# Altium footprint library 布洛电子PCB封装库-通用接插件.PcbLib: 103 footprints (part 2 of 7)
Each footprint in its own frame and in the unit in brackets; x right, y up, seen from the top. Pads: shape width x height; smd on the part's side, far side on the other; paste and mask are expansions set on the pad; w line width, h text height; cw(c..) or ccw(c..) is an arc to the next point about the centre after c.
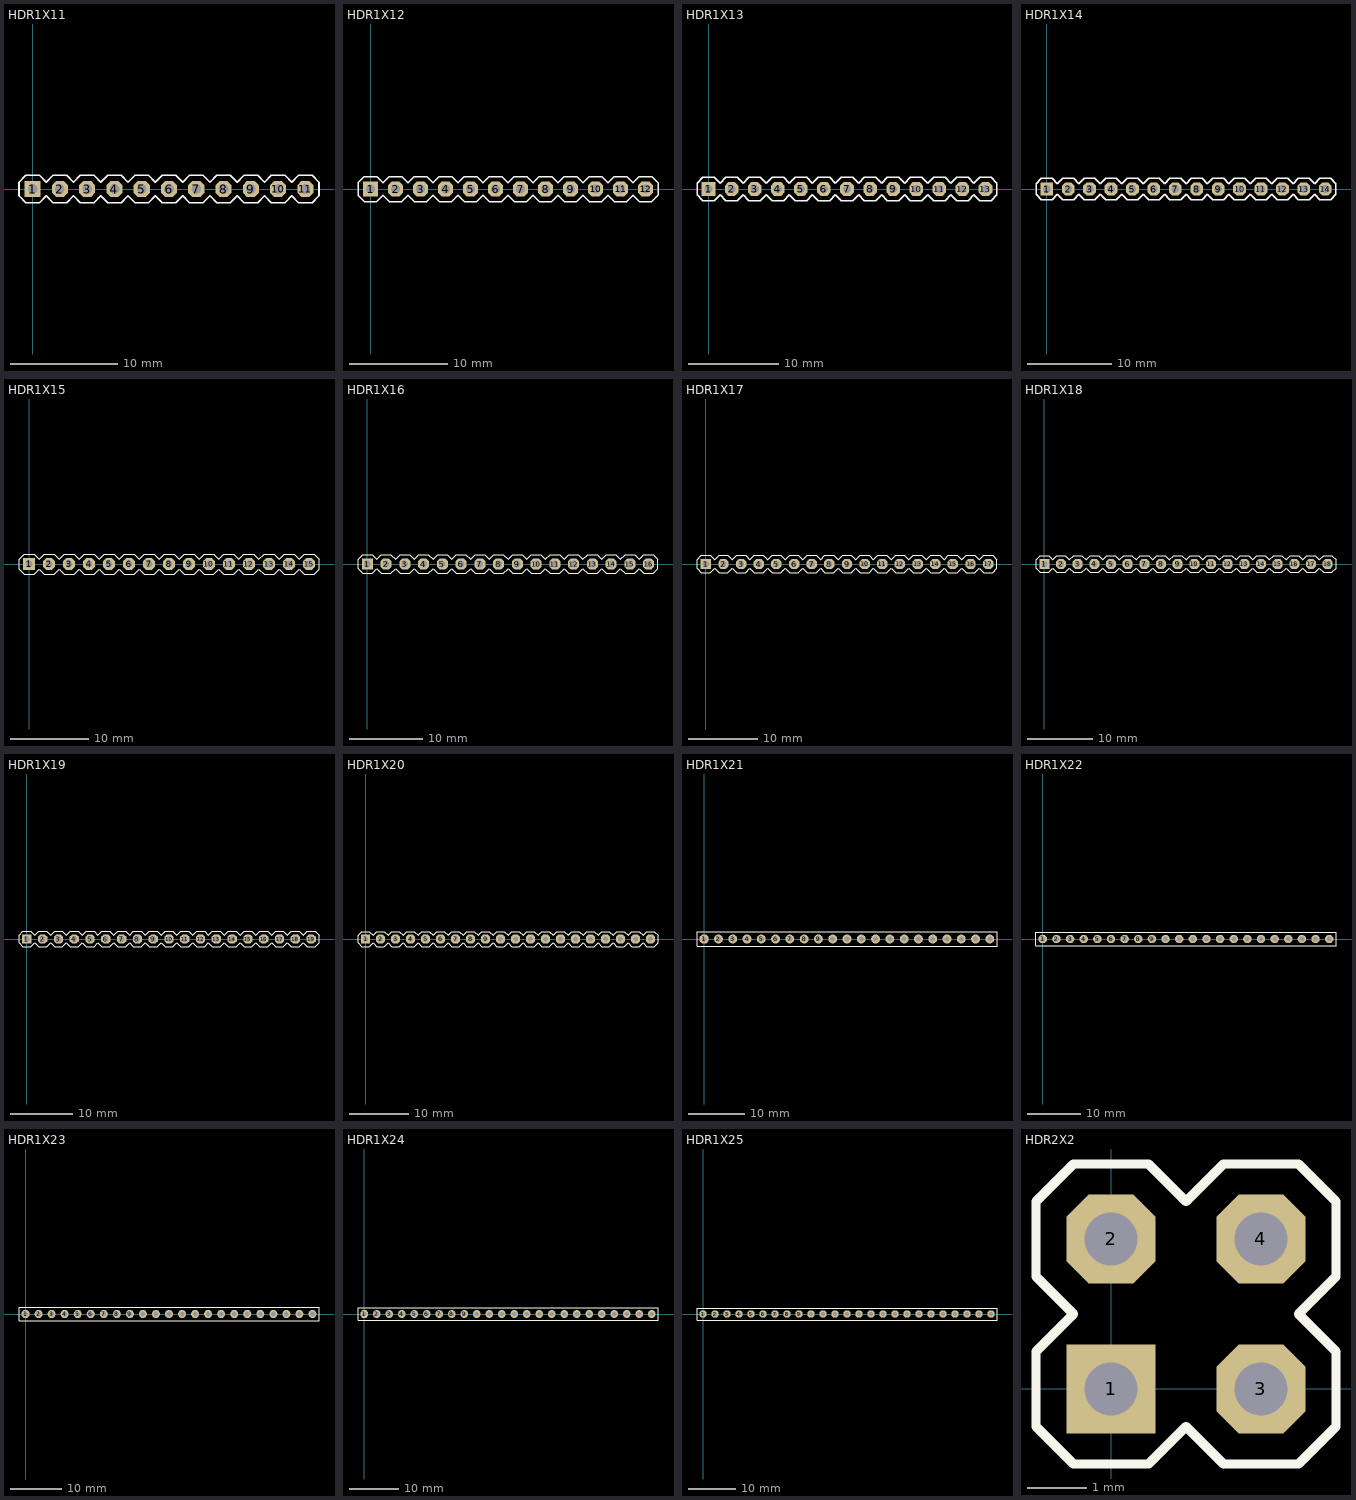
[diagram p1: the footprints below, top view; thin cyan lines are the x and y axes]

## HDR1X11 [mm] "Connector; Header; 11 Position"
pads (11):
  rect 1.5x1.5 hole 0.9: 1(0,0)
  oct 1.5x1.5 hole 0.9: 2(2.54,0) 3(5.08,0) 4(7.62,0) 5(10.16,0) 6(12.7,0) 7(15.24,0) 8(17.78,0) 9(20.32,0) 10(22.86,0) 11(25.4,0)
Top Overlay:
  lines w0.152: -1.27,-0.635 -1.27,0.635 -0.635,1.27 0.635,1.27 1.27,0.635 1.905,1.27 3.175,1.27 3.81,0.635 4.445,1.27 5.715,1.27 6.35,0.635 6.985,1.27 8.255,1.27 8.89,0.635 9.525,1.27 10.795,1.27 11.43,0.635 12.065,1.27 13.335,1.27 13.97,0.635 14.605,1.27 15.875,1.27 16.51,0.635 17.145,1.27 18.415,1.27 19.05,0.635 19.685,1.27 20.955,1.27 21.59,0.635 22.225,1.27 23.495,1.27 24.13,0.635 24.765,1.27 26.035,1.27 26.67,0.635 26.67,-0.635 26.035,-1.27 24.765,-1.27 24.13,-0.635 23.495,-1.27 22.225,-1.27 21.59,-0.635 20.955,-1.27 19.685,-1.27 19.05,-0.635 18.415,-1.27 17.145,-1.27 16.51,-0.635 15.875,-1.27 14.605,-1.27 13.97,-0.635 13.335,-1.27 12.065,-1.27 11.43,-0.635 10.795,-1.27 9.525,-1.27 8.89,-0.635 8.255,-1.27 6.985,-1.27 6.35,-0.635 5.715,-1.27 4.445,-1.27 3.81,-0.635 3.175,-1.27 1.905,-1.27 1.27,-0.635 0.635,-1.27 -0.635,-1.27 -1.27,-0.635
3D body: height 7.58, standoff -2.94, extent 24.13,-1.27 26.67,1.27
3D body: height 7.58, standoff -2.94, extent 21.59,-1.27 24.13,1.27
3D body: height 7.58, standoff -2.94, extent 19.05,-1.27 21.59,1.27
3D body: height 7.58, standoff -2.94, extent 16.51,-1.27 19.05,1.27
3D body: height 7.58, standoff -2.94, extent 13.97,-1.27 16.51,1.27
3D body: height 7.58, standoff -2.94, extent 11.43,-1.27 13.97,1.27
3D body: height 7.58, standoff -2.94, extent 8.89,-1.27 11.43,1.27
3D body: height 7.58, standoff -2.94, extent 6.35,-1.27 8.89,1.27
3D body: height 7.58, standoff -2.94, extent 3.81,-1.27 6.35,1.27
3D body: height 7.58, standoff -2.94, extent 1.27,-1.27 3.81,1.27
3D body: height 7.58, standoff -2.94, extent -1.27,-1.27 1.27,1.27

## HDR1X12 [mm] "Connector; Header; 12 Position"
pads (12):
  rect 1.5x1.5 hole 0.9: 1(0,0)
  oct 1.5x1.5 hole 0.9: 2(2.54,0) 3(5.08,0) 4(7.62,0) 5(10.16,0) 6(12.7,0) 7(15.24,0) 8(17.78,0) 9(20.32,0) 10(22.86,0) 11(25.4,0) 12(27.94,0)
Top Overlay:
  lines w0.152: -1.27,-0.635 -1.27,0.635 -0.635,1.27 0.635,1.27 1.27,0.635 1.905,1.27 3.175,1.27 3.81,0.635 4.445,1.27 5.715,1.27 6.35,0.635 6.985,1.27 8.255,1.27 8.89,0.635 9.525,1.27 10.795,1.27 11.43,0.635 12.065,1.27 13.335,1.27 13.97,0.635 14.605,1.27 15.875,1.27 16.51,0.635 17.145,1.27 18.415,1.27 19.05,0.635 19.685,1.27 20.955,1.27 21.59,0.635 22.225,1.27 23.495,1.27 24.13,0.635 24.765,1.27 26.035,1.27 26.67,0.635 27.305,1.27 28.575,1.27 29.21,0.635 29.21,-0.635 28.575,-1.27 27.305,-1.27 26.67,-0.635 26.035,-1.27 24.765,-1.27 24.13,-0.635 23.495,-1.27 22.225,-1.27 21.59,-0.635 20.955,-1.27 19.685,-1.27 19.05,-0.635 18.415,-1.27 17.145,-1.27 16.51,-0.635 15.875,-1.27 14.605,-1.27 13.97,-0.635 13.335,-1.27 12.065,-1.27 11.43,-0.635 10.795,-1.27 9.525,-1.27 8.89,-0.635 8.255,-1.27 6.985,-1.27 6.35,-0.635 5.715,-1.27 4.445,-1.27 3.81,-0.635 3.175,-1.27 1.905,-1.27 1.27,-0.635 0.635,-1.27 -0.635,-1.27 -1.27,-0.635
3D body: height 7.58, standoff -2.94, extent 26.67,-1.27 29.21,1.27
3D body: height 7.58, standoff -2.94, extent 24.13,-1.27 26.67,1.27
3D body: height 7.58, standoff -2.94, extent 21.59,-1.27 24.13,1.27
3D body: height 7.58, standoff -2.94, extent 19.05,-1.27 21.59,1.27
3D body: height 7.58, standoff -2.94, extent 16.51,-1.27 19.05,1.27
3D body: height 7.58, standoff -2.94, extent 13.97,-1.27 16.51,1.27
3D body: height 7.58, standoff -2.94, extent 11.43,-1.27 13.97,1.27
3D body: height 7.58, standoff -2.94, extent 8.89,-1.27 11.43,1.27
3D body: height 7.58, standoff -2.94, extent 6.35,-1.27 8.89,1.27
3D body: height 7.58, standoff -2.94, extent 3.81,-1.27 6.35,1.27
3D body: height 7.58, standoff -2.94, extent 1.27,-1.27 3.81,1.27
3D body: height 7.58, standoff -2.94, extent -1.27,-1.27 1.27,1.27

## HDR1X13 [mm] "Connector; Header; 13 Position"
pads (13):
  rect 1.5x1.5 hole 0.9: 1(0,0)
  oct 1.5x1.5 hole 0.9: 2(2.54,0) 3(5.08,0) 4(7.62,0) 5(10.16,0) 6(12.7,0) 7(15.24,0) 8(17.78,0) 9(20.32,0) 10(22.86,0) 11(25.4,0) 12(27.94,0) 13(30.48,0)
Top Overlay:
  lines w0.152: -1.27,-0.635 -1.27,0.635 -0.635,1.27 0.635,1.27 1.27,0.635 1.905,1.27 3.175,1.27 3.81,0.635 4.445,1.27 5.715,1.27 6.35,0.635 6.985,1.27 8.255,1.27 8.89,0.635 9.525,1.27 10.795,1.27 11.43,0.635 12.065,1.27 13.335,1.27 13.97,0.635 14.605,1.27 15.875,1.27 16.51,0.635 17.145,1.27 18.415,1.27 19.05,0.635 19.685,1.27 20.955,1.27 21.59,0.635 22.225,1.27 23.495,1.27 24.13,0.635 24.765,1.27 26.035,1.27 26.67,0.635 27.305,1.27 28.575,1.27 29.21,0.635 29.845,1.27 31.115,1.27 31.75,0.635 31.75,-0.635 31.115,-1.27 29.845,-1.27 29.21,-0.635 28.575,-1.27 27.305,-1.27 26.67,-0.635 26.035,-1.27 24.765,-1.27 24.13,-0.635 23.495,-1.27 22.225,-1.27 21.59,-0.635 20.955,-1.27 19.685,-1.27 19.05,-0.635 18.415,-1.27 17.145,-1.27 16.51,-0.635 15.875,-1.27 14.605,-1.27 13.97,-0.635 13.335,-1.27 12.065,-1.27 11.43,-0.635 10.795,-1.27 9.525,-1.27 8.89,-0.635 8.255,-1.27 6.985,-1.27 6.35,-0.635 5.715,-1.27 4.445,-1.27 3.81,-0.635 3.175,-1.27 1.905,-1.27 1.27,-0.635 0.635,-1.27 -0.635,-1.27 -1.27,-0.635
3D body: height 7.58, standoff -2.94, extent 29.21,-1.27 31.75,1.27
3D body: height 7.58, standoff -2.94, extent 26.67,-1.27 29.21,1.27
3D body: height 7.58, standoff -2.94, extent 24.13,-1.27 26.67,1.27
3D body: height 7.58, standoff -2.94, extent 21.59,-1.27 24.13,1.27
3D body: height 7.58, standoff -2.94, extent 19.05,-1.27 21.59,1.27
3D body: height 7.58, standoff -2.94, extent 16.51,-1.27 19.05,1.27
3D body: height 7.58, standoff -2.94, extent 13.97,-1.27 16.51,1.27
3D body: height 7.58, standoff -2.94, extent 11.43,-1.27 13.97,1.27
3D body: height 7.58, standoff -2.94, extent 8.89,-1.27 11.43,1.27
3D body: height 7.58, standoff -2.94, extent 6.35,-1.27 8.89,1.27
3D body: height 7.58, standoff -2.94, extent 3.81,-1.27 6.35,1.27
3D body: height 7.58, standoff -2.94, extent 1.27,-1.27 3.81,1.27
3D body: height 7.58, standoff -2.94, extent -1.27,-1.27 1.27,1.27

## HDR1X14 [mm] "Connector; Header; 14 Position"
pads (14):
  rect 1.5x1.5 hole 0.9: 1(0,0)
  oct 1.5x1.5 hole 0.9: 2(2.54,0) 3(5.08,0) 4(7.62,0) 5(10.16,0) 6(12.7,0) 7(15.24,0) 8(17.78,0) 9(20.32,0) 10(22.86,0) 11(25.4,0) 12(27.94,0) 13(30.48,0) 14(33.02,0)
Top Overlay:
  lines w0.152: -1.27,-0.635 -1.27,0.635 -0.635,1.27 0.635,1.27 1.27,0.635 1.905,1.27 3.175,1.27 3.81,0.635 4.445,1.27 5.715,1.27 6.35,0.635 6.985,1.27 8.255,1.27 8.89,0.635 9.525,1.27 10.795,1.27 11.43,0.635 12.065,1.27 13.335,1.27 13.97,0.635 14.605,1.27 15.875,1.27 16.51,0.635 17.145,1.27 18.415,1.27 19.05,0.635 19.685,1.27 20.955,1.27 21.59,0.635 22.225,1.27 23.495,1.27 24.13,0.635 24.765,1.27 26.035,1.27 26.67,0.635 27.305,1.27 28.575,1.27 29.21,0.635 29.845,1.27 31.115,1.27 31.75,0.635 32.385,1.27 33.655,1.27 34.29,0.635 34.29,-0.635 33.655,-1.27 32.385,-1.27 31.75,-0.635 31.115,-1.27 29.845,-1.27 29.21,-0.635 28.575,-1.27 27.305,-1.27 26.67,-0.635 26.035,-1.27 24.765,-1.27 24.13,-0.635 23.495,-1.27 22.225,-1.27 21.59,-0.635 20.955,-1.27 19.685,-1.27 19.05,-0.635 18.415,-1.27 17.145,-1.27 16.51,-0.635 15.875,-1.27 14.605,-1.27 13.97,-0.635 13.335,-1.27 12.065,-1.27 11.43,-0.635 10.795,-1.27 9.525,-1.27 8.89,-0.635 8.255,-1.27 6.985,-1.27 6.35,-0.635 5.715,-1.27 4.445,-1.27 3.81,-0.635 3.175,-1.27 1.905,-1.27 1.27,-0.635 0.635,-1.27 -0.635,-1.27 -1.27,-0.635
3D body: height 7.58, standoff -2.94, extent 29.21,-1.27 31.75,1.27
3D body: height 7.58, standoff -2.94, extent 31.75,-1.27 34.29,1.27
3D body: height 7.58, standoff -2.94, extent 19.05,-1.27 21.59,1.27
3D body: height 7.58, standoff -2.94, extent 21.59,-1.27 24.13,1.27
3D body: height 7.58, standoff -2.94, extent 24.13,-1.27 26.67,1.27
3D body: height 7.58, standoff -2.94, extent 26.67,-1.27 29.21,1.27
3D body: height 7.58, standoff -2.94, extent 8.89,-1.27 11.43,1.27
3D body: height 7.58, standoff -2.94, extent 11.43,-1.27 13.97,1.27
3D body: height 7.58, standoff -2.94, extent 13.97,-1.27 16.51,1.27
3D body: height 7.58, standoff -2.94, extent 16.51,-1.27 19.05,1.27
3D body: height 7.58, standoff -2.94, extent 6.35,-1.27 8.89,1.27
3D body: height 7.58, standoff -2.94, extent 3.81,-1.27 6.35,1.27
3D body: height 7.58, standoff -2.94, extent 1.27,-1.27 3.81,1.27
3D body: height 7.58, standoff -2.94, extent -1.27,-1.27 1.27,1.27

## HDR1X15 [mm] "Connector; Header; 15 Position"
pads (15):
  rect 1.5x1.5 hole 0.9: 1(0,0)
  oct 1.5x1.5 hole 0.9: 2(2.54,0) 3(5.08,0) 4(7.62,0) 5(10.16,0) 6(12.7,0) 7(15.24,0) 8(17.78,0) 9(20.32,0) 10(22.86,0) 11(25.4,0) 12(27.94,0) 13(30.48,0) 14(33.02,0) 15(35.56,0)
Top Overlay:
  lines w0.152: -1.27,-0.635 -0.635,-1.27 0.635,-1.27 1.27,-0.635 1.905,-1.27 3.175,-1.27 3.81,-0.635 4.445,-1.27 5.715,-1.27 6.35,-0.635 6.985,-1.27 8.255,-1.27 8.89,-0.635 9.525,-1.27 10.795,-1.27 11.43,-0.635 12.065,-1.27 13.335,-1.27 13.97,-0.635 14.605,-1.27 15.875,-1.27 16.51,-0.635 17.145,-1.27 18.415,-1.27 19.05,-0.635 19.685,-1.27 20.955,-1.27 21.59,-0.635 22.225,-1.27 23.495,-1.27 24.13,-0.635 24.765,-1.27 26.035,-1.27 26.67,-0.635 27.305,-1.27 28.575,-1.27 29.21,-0.635 29.845,-1.27 31.115,-1.27 31.75,-0.635 32.385,-1.27 33.655,-1.27 34.29,-0.635 34.925,-1.27 36.195,-1.27 36.83,-0.635 36.83,0.635 36.195,1.27 34.925,1.27 34.29,0.635 33.655,1.27 32.385,1.27 31.75,0.635 31.115,1.27 29.845,1.27 29.21,0.635 28.575,1.27 27.305,1.27 26.67,0.635 26.035,1.27 24.765,1.27 24.13,0.635 23.495,1.27 22.225,1.27 21.59,0.635 20.955,1.27 19.685,1.27 19.05,0.635 18.415,1.27 17.145,1.27 16.51,0.635 15.875,1.27 14.605,1.27 13.97,0.635 13.335,1.27 12.065,1.27 11.43,0.635 10.795,1.27 9.525,1.27 8.89,0.635 8.255,1.27 6.985,1.27 6.35,0.635 5.715,1.27 4.445,1.27 3.81,0.635 3.175,1.27 1.905,1.27 1.27,0.635 0.635,1.27 -0.635,1.27 -1.27,0.635 -1.27,-0.635
3D body: height 7.58, standoff -2.94, extent 6.35,-1.27 8.89,1.27
3D body: height 7.58, standoff -2.94, extent 3.81,-1.27 6.35,1.27
3D body: height 7.58, standoff -2.94, extent 1.27,-1.27 3.81,1.27
3D body: height 7.58, standoff -2.94, extent -1.27,-1.27 1.27,1.27
3D body: height 7.58, standoff -2.94, extent 16.51,-1.27 19.05,1.27
3D body: height 7.58, standoff -2.94, extent 13.97,-1.27 16.51,1.27
3D body: height 7.58, standoff -2.94, extent 11.43,-1.27 13.97,1.27
3D body: height 7.58, standoff -2.94, extent 8.89,-1.27 11.43,1.27
3D body: height 7.58, standoff -2.94, extent 26.67,-1.27 29.21,1.27
3D body: height 7.58, standoff -2.94, extent 24.13,-1.27 26.67,1.27
3D body: height 7.58, standoff -2.94, extent 21.59,-1.27 24.13,1.27
3D body: height 7.58, standoff -2.94, extent 19.05,-1.27 21.59,1.27
3D body: height 7.58, standoff -2.94, extent 34.29,-1.27 36.83,1.27
3D body: height 7.58, standoff -2.94, extent 31.75,-1.27 34.29,1.27
3D body: height 7.58, standoff -2.94, extent 29.21,-1.27 31.75,1.27

## HDR1X16 [mm] "Connector; Header; 16 Position"
pads (16):
  rect 1.5x1.5 hole 0.9: 1(0,0)
  oct 1.5x1.5 hole 0.9: 2(2.54,0) 3(5.08,0) 4(7.62,0) 5(10.16,0) 6(12.7,0) 7(15.24,0) 8(17.78,0) 9(20.32,0) 10(22.86,0) 11(25.4,0) 12(27.94,0) 13(30.48,0) 14(33.02,0) 15(35.56,0) 16(38.1,0)
Top Overlay:
  lines w0.152: -1.27,-0.635 -0.635,-1.27 0.635,-1.27 1.27,-0.635 1.905,-1.27 3.175,-1.27 3.81,-0.635 4.445,-1.27 5.715,-1.27 6.35,-0.635 6.985,-1.27 8.255,-1.27 8.89,-0.635 9.525,-1.27 10.795,-1.27 11.43,-0.635 12.065,-1.27 13.335,-1.27 13.97,-0.635 14.605,-1.27 15.875,-1.27 16.51,-0.635 17.145,-1.27 18.415,-1.27 19.05,-0.635 19.685,-1.27 20.955,-1.27 21.59,-0.635 22.225,-1.27 23.495,-1.27 24.13,-0.635 24.765,-1.27 26.035,-1.27 26.67,-0.635 27.305,-1.27 28.575,-1.27 29.21,-0.635 29.845,-1.27 31.115,-1.27 31.75,-0.635 32.385,-1.27 33.655,-1.27 34.29,-0.635 34.925,-1.27 36.195,-1.27 36.83,-0.635 37.465,-1.27 38.735,-1.27 39.37,-0.635 39.37,0.635 38.735,1.27 37.465,1.27 36.83,0.635 36.195,1.27 34.925,1.27 34.29,0.635 33.655,1.27 32.385,1.27 31.75,0.635 31.115,1.27 29.845,1.27 29.21,0.635 28.575,1.27 27.305,1.27 26.67,0.635 26.035,1.27 24.765,1.27 24.13,0.635 23.495,1.27 22.225,1.27 21.59,0.635 20.955,1.27 19.685,1.27 19.05,0.635 18.415,1.27 17.145,1.27 16.51,0.635 15.875,1.27 14.605,1.27 13.97,0.635 13.335,1.27 12.065,1.27 11.43,0.635 10.795,1.27 9.525,1.27 8.89,0.635 8.255,1.27 6.985,1.27 6.35,0.635 5.715,1.27 4.445,1.27 3.81,0.635 3.175,1.27 1.905,1.27 1.27,0.635 0.635,1.27 -0.635,1.27 -1.27,0.635 -1.27,-0.635
3D body: height 7.58, standoff -2.94, extent 6.35,-1.27 8.89,1.27
3D body: height 7.58, standoff -2.94, extent 3.81,-1.27 6.35,1.27
3D body: height 7.58, standoff -2.94, extent 1.27,-1.27 3.81,1.27
3D body: height 7.58, standoff -2.94, extent -1.27,-1.27 1.27,1.27
3D body: height 7.58, standoff -2.94, extent 16.51,-1.27 19.05,1.27
3D body: height 7.58, standoff -2.94, extent 13.97,-1.27 16.51,1.27
3D body: height 7.58, standoff -2.94, extent 11.43,-1.27 13.97,1.27
3D body: height 7.58, standoff -2.94, extent 8.89,-1.27 11.43,1.27
3D body: height 7.58, standoff -2.94, extent 26.67,-1.27 29.21,1.27
3D body: height 7.58, standoff -2.94, extent 24.13,-1.27 26.67,1.27
3D body: height 7.58, standoff -2.94, extent 21.59,-1.27 24.13,1.27
3D body: height 7.58, standoff -2.94, extent 19.05,-1.27 21.59,1.27
3D body: height 7.58, standoff -2.94, extent 36.83,-1.27 39.37,1.27
3D body: height 7.58, standoff -2.94, extent 34.29,-1.27 36.83,1.27
3D body: height 7.58, standoff -2.94, extent 31.75,-1.27 34.29,1.27
3D body: height 7.58, standoff -2.94, extent 29.21,-1.27 31.75,1.27

## HDR1X17 [mm] "Connector; Header; 17 Position"
pads (17):
  rect 1.5x1.5 hole 0.9: 1(0,0)
  oct 1.5x1.5 hole 0.9: 2(2.54,0) 3(5.08,0) 4(7.62,0) 5(10.16,0) 6(12.7,0) 7(15.24,0) 8(17.78,0) 9(20.32,0) 10(22.86,0) 11(25.4,0) 12(27.94,0) 13(30.48,0) 14(33.02,0) 15(35.56,0) 16(38.1,0) 17(40.64,0)
Top Overlay:
  lines w0.152: -1.27,-0.635 -1.27,0.635 -0.635,1.27 0.635,1.27 1.27,0.635 1.905,1.27 3.175,1.27 3.81,0.635 4.445,1.27 5.715,1.27 6.35,0.635 6.985,1.27 8.255,1.27 8.89,0.635 9.525,1.27 10.795,1.27 11.43,0.635 12.065,1.27 13.335,1.27 13.97,0.635 14.605,1.27 15.875,1.27 16.51,0.635 17.145,1.27 18.415,1.27 19.05,0.635 19.685,1.27 20.955,1.27 21.59,0.635 22.225,1.27 23.495,1.27 24.13,0.635 24.765,1.27 26.035,1.27 26.67,0.635 27.305,1.27 28.575,1.27 29.21,0.635 29.845,1.27 31.115,1.27 31.75,0.635 32.385,1.27 33.655,1.27 34.29,0.635 34.925,1.27 36.195,1.27 36.83,0.635 37.465,1.27 38.735,1.27 39.37,0.635 40.005,1.27 41.275,1.27 41.91,0.635 41.91,-0.635 41.275,-1.27 40.005,-1.27 39.37,-0.635 38.735,-1.27 37.465,-1.27 36.83,-0.635 36.195,-1.27 34.925,-1.27 34.29,-0.635 33.655,-1.27 32.385,-1.27 31.75,-0.635 31.115,-1.27 29.845,-1.27 29.21,-0.635 28.575,-1.27 27.305,-1.27 26.67,-0.635 26.035,-1.27 24.765,-1.27 24.13,-0.635 23.495,-1.27 22.225,-1.27 21.59,-0.635 20.955,-1.27 19.685,-1.27 19.05,-0.635 18.415,-1.27 17.145,-1.27 16.51,-0.635 15.875,-1.27 14.605,-1.27 13.97,-0.635 13.335,-1.27 12.065,-1.27 11.43,-0.635 10.795,-1.27 9.525,-1.27 8.89,-0.635 8.255,-1.27 6.985,-1.27 6.35,-0.635 5.715,-1.27 4.445,-1.27 3.81,-0.635 3.175,-1.27 1.905,-1.27 1.27,-0.635 0.635,-1.27 -0.635,-1.27 -1.27,-0.635
3D body: height 7.58, standoff -2.94, extent 39.37,-1.27 41.91,1.27
3D body: height 7.58, standoff -2.94, extent 29.21,-1.27 31.75,1.27
3D body: height 7.58, standoff -2.94, extent 31.75,-1.27 34.29,1.27
3D body: height 7.58, standoff -2.94, extent 34.29,-1.27 36.83,1.27
3D body: height 7.58, standoff -2.94, extent 36.83,-1.27 39.37,1.27
3D body: height 7.58, standoff -2.94, extent 19.05,-1.27 21.59,1.27
3D body: height 7.58, standoff -2.94, extent 21.59,-1.27 24.13,1.27
3D body: height 7.58, standoff -2.94, extent 24.13,-1.27 26.67,1.27
3D body: height 7.58, standoff -2.94, extent 26.67,-1.27 29.21,1.27
3D body: height 7.58, standoff -2.94, extent 8.89,-1.27 11.43,1.27
3D body: height 7.58, standoff -2.94, extent 11.43,-1.27 13.97,1.27
3D body: height 7.58, standoff -2.94, extent 13.97,-1.27 16.51,1.27
3D body: height 7.58, standoff -2.94, extent 16.51,-1.27 19.05,1.27
3D body: height 7.58, standoff -2.94, extent -1.27,-1.27 1.27,1.27
3D body: height 7.58, standoff -2.94, extent 1.27,-1.27 3.81,1.27
3D body: height 7.58, standoff -2.94, extent 3.81,-1.27 6.35,1.27
3D body: height 7.58, standoff -2.94, extent 6.35,-1.27 8.89,1.27

## HDR1X18 [mm] "Connector; Header; 18 Position"
pads (18):
  rect 1.5x1.5 hole 0.9: 1(0,0)
  oct 1.5x1.5 hole 0.9: 2(2.54,0) 3(5.08,0) 4(7.62,0) 5(10.16,0) 6(12.7,0) 7(15.24,0) 8(17.78,0) 9(20.32,0) 10(22.86,0) 11(25.4,0) 12(27.94,0) 13(30.48,0) 14(33.02,0) 15(35.56,0) 16(38.1,0) 17(40.64,0) 18(43.18,0)
Top Overlay:
  lines w0.152: -1.27,-0.635 -1.27,0.635 -0.635,1.27 0.635,1.27 1.27,0.635 1.905,1.27 3.175,1.27 3.81,0.635 4.445,1.27 5.715,1.27 6.35,0.635 6.985,1.27 8.255,1.27 8.89,0.635 9.525,1.27 10.795,1.27 11.43,0.635 12.065,1.27 13.335,1.27 13.97,0.635 14.605,1.27 15.875,1.27 16.51,0.635 17.145,1.27 18.415,1.27 19.05,0.635 19.685,1.27 20.955,1.27 21.59,0.635 22.225,1.27 23.495,1.27 24.13,0.635 24.765,1.27 26.035,1.27 26.67,0.635 27.305,1.27 28.575,1.27 29.21,0.635 29.845,1.27 31.115,1.27 31.75,0.635 32.385,1.27 33.655,1.27 34.29,0.635 34.925,1.27 36.195,1.27 36.83,0.635 37.465,1.27 38.735,1.27 39.37,0.635 40.005,1.27 41.275,1.27 41.91,0.635 42.545,1.27 43.815,1.27 44.45,0.635 44.45,-0.635 43.815,-1.27 42.545,-1.27 41.91,-0.635 41.275,-1.27 40.005,-1.27 39.37,-0.635 38.735,-1.27 37.465,-1.27 36.83,-0.635 36.195,-1.27 34.925,-1.27 34.29,-0.635 33.655,-1.27 32.385,-1.27 31.75,-0.635 31.115,-1.27 29.845,-1.27 29.21,-0.635 28.575,-1.27 27.305,-1.27 26.67,-0.635 26.035,-1.27 24.765,-1.27 24.13,-0.635 23.495,-1.27 22.225,-1.27 21.59,-0.635 20.955,-1.27 19.685,-1.27 19.05,-0.635 18.415,-1.27 17.145,-1.27 16.51,-0.635 15.875,-1.27 14.605,-1.27 13.97,-0.635 13.335,-1.27 12.065,-1.27 11.43,-0.635 10.795,-1.27 9.525,-1.27 8.89,-0.635 8.255,-1.27 6.985,-1.27 6.35,-0.635 5.715,-1.27 4.445,-1.27 3.81,-0.635 3.175,-1.27 1.905,-1.27 1.27,-0.635 0.635,-1.27 -0.635,-1.27 -1.27,-0.635
3D body: height 7.58, standoff -2.94, extent 39.37,-1.27 41.91,1.27
3D body: height 7.58, standoff -2.94, extent 41.91,-1.27 44.45,1.27
3D body: height 7.58, standoff -2.94, extent 29.21,-1.27 31.75,1.27
3D body: height 7.58, standoff -2.94, extent 31.75,-1.27 34.29,1.27
3D body: height 7.58, standoff -2.94, extent 34.29,-1.27 36.83,1.27
3D body: height 7.58, standoff -2.94, extent 36.83,-1.27 39.37,1.27
3D body: height 7.58, standoff -2.94, extent 19.05,-1.27 21.59,1.27
3D body: height 7.58, standoff -2.94, extent 21.59,-1.27 24.13,1.27
3D body: height 7.58, standoff -2.94, extent 24.13,-1.27 26.67,1.27
3D body: height 7.58, standoff -2.94, extent 26.67,-1.27 29.21,1.27
3D body: height 7.58, standoff -2.94, extent 8.89,-1.27 11.43,1.27
3D body: height 7.58, standoff -2.94, extent 11.43,-1.27 13.97,1.27
3D body: height 7.58, standoff -2.94, extent 13.97,-1.27 16.51,1.27
3D body: height 7.58, standoff -2.94, extent 16.51,-1.27 19.05,1.27
3D body: height 7.58, standoff -2.94, extent -1.27,-1.27 1.27,1.27
3D body: height 7.58, standoff -2.94, extent 1.27,-1.27 3.81,1.27
3D body: height 7.58, standoff -2.94, extent 3.81,-1.27 6.35,1.27
3D body: height 7.58, standoff -2.94, extent 6.35,-1.27 8.89,1.27

## HDR1X19 [mm] "Connector; Header; 19 Position"
pads (19):
  rect 1.5x1.5 hole 0.9: 1(0,0)
  oct 1.5x1.5 hole 0.9: 2(2.54,0) 3(5.08,0) 4(7.62,0) 5(10.16,0) 6(12.7,0) 7(15.24,0) 8(17.78,0) 9(20.32,0) 10(22.86,0) 11(25.4,0) 12(27.94,0) 13(30.48,0) 14(33.02,0) 15(35.56,0) 16(38.1,0) 17(40.64,0) 18(43.18,0) 19(45.72,0)
Top Overlay:
  lines w0.152: -1.27,-0.635 -1.27,0.635 -0.635,1.27 0.635,1.27 1.27,0.635 1.905,1.27 3.175,1.27 3.81,0.635 4.445,1.27 5.715,1.27 6.35,0.635 6.985,1.27 8.255,1.27 8.89,0.635 9.525,1.27 10.795,1.27 11.43,0.635 12.065,1.27 13.335,1.27 13.97,0.635 14.605,1.27 15.875,1.27 16.51,0.635 17.145,1.27 18.415,1.27 19.05,0.635 19.685,1.27 20.955,1.27 21.59,0.635 22.225,1.27 23.495,1.27 24.13,0.635 24.765,1.27 26.035,1.27 26.67,0.635 27.305,1.27 28.575,1.27 29.21,0.635 29.845,1.27 31.115,1.27 31.75,0.635 32.385,1.27 33.655,1.27 34.29,0.635 34.925,1.27 36.195,1.27 36.83,0.635 37.465,1.27 38.735,1.27 39.37,0.635 40.005,1.27 41.275,1.27 41.91,0.635 42.545,1.27 43.815,1.27 44.45,0.635 45.085,1.27 46.355,1.27 46.99,0.635 46.99,-0.635 46.355,-1.27 45.085,-1.27 44.45,-0.635 43.815,-1.27 42.545,-1.27 41.91,-0.635 41.275,-1.27 40.005,-1.27 39.37,-0.635 38.735,-1.27 37.465,-1.27 36.83,-0.635 36.195,-1.27 34.925,-1.27 34.29,-0.635 33.655,-1.27 32.385,-1.27 31.75,-0.635 31.115,-1.27 29.845,-1.27 29.21,-0.635 28.575,-1.27 27.305,-1.27 26.67,-0.635 26.035,-1.27 24.765,-1.27 24.13,-0.635 23.495,-1.27 22.225,-1.27 21.59,-0.635 20.955,-1.27 19.685,-1.27 19.05,-0.635 18.415,-1.27 17.145,-1.27 16.51,-0.635 15.875,-1.27 14.605,-1.27 13.97,-0.635 13.335,-1.27 12.065,-1.27 11.43,-0.635 10.795,-1.27 9.525,-1.27 8.89,-0.635 8.255,-1.27 6.985,-1.27 6.35,-0.635 5.715,-1.27 4.445,-1.27 3.81,-0.635 3.175,-1.27 1.905,-1.27 1.27,-0.635 0.635,-1.27 -0.635,-1.27 -1.27,-0.635
3D body: height 7.58, standoff -2.94, extent 6.35,-1.27 8.89,1.27
3D body: height 7.58, standoff -2.94, extent 3.81,-1.27 6.35,1.27
3D body: height 7.58, standoff -2.94, extent 1.27,-1.27 3.81,1.27
3D body: height 7.58, standoff -2.94, extent -1.27,-1.27 1.27,1.27
3D body: height 7.58, standoff -2.94, extent 16.51,-1.27 19.05,1.27
3D body: height 7.58, standoff -2.94, extent 13.97,-1.27 16.51,1.27
3D body: height 7.58, standoff -2.94, extent 11.43,-1.27 13.97,1.27
3D body: height 7.58, standoff -2.94, extent 8.89,-1.27 11.43,1.27
3D body: height 7.58, standoff -2.94, extent 26.67,-1.27 29.21,1.27
3D body: height 7.58, standoff -2.94, extent 24.13,-1.27 26.67,1.27
3D body: height 7.58, standoff -2.94, extent 21.59,-1.27 24.13,1.27
3D body: height 7.58, standoff -2.94, extent 19.05,-1.27 21.59,1.27
3D body: height 7.58, standoff -2.94, extent 36.83,-1.27 39.37,1.27
3D body: height 7.58, standoff -2.94, extent 34.29,-1.27 36.83,1.27
3D body: height 7.58, standoff -2.94, extent 31.75,-1.27 34.29,1.27
3D body: height 7.58, standoff -2.94, extent 29.21,-1.27 31.75,1.27
3D body: height 7.58, standoff -2.94, extent 44.45,-1.27 46.99,1.27
3D body: height 7.58, standoff -2.94, extent 41.91,-1.27 44.45,1.27
3D body: height 7.58, standoff -2.94, extent 39.37,-1.27 41.91,1.27

## HDR1X20 [mm] "Connector; Header; 20 Position"
pads (20):
  rect 1.5x1.5 hole 0.9: 1(0,0)
  oct 1.5x1.5 hole 0.9: 2(2.54,0) 3(5.08,0) 4(7.62,0) 5(10.16,0) 6(12.7,0) 7(15.24,0) 8(17.78,0) 9(20.32,0) 10(22.86,0) 11(25.4,0) 12(27.94,0) 13(30.48,0) 14(33.02,0) 15(35.56,0) 16(38.1,0) 17(40.64,0) 18(43.18,0) 19(45.72,0) 20(48.26,0)
Top Overlay:
  lines w0.152: -1.27,-0.635 -1.27,0.635 -0.635,1.27 0.635,1.27 1.27,0.635 1.905,1.27 3.175,1.27 3.81,0.635 4.445,1.27 5.715,1.27 6.35,0.635 6.985,1.27 8.255,1.27 8.89,0.635 9.525,1.27 10.795,1.27 11.43,0.635 12.065,1.27 13.335,1.27 13.97,0.635 14.605,1.27 15.875,1.27 16.51,0.635 17.145,1.27 18.415,1.27 19.05,0.635 19.685,1.27 20.955,1.27 21.59,0.635 22.225,1.27 23.495,1.27 24.13,0.635 24.765,1.27 26.035,1.27 26.67,0.635 27.305,1.27 28.575,1.27 29.21,0.635 29.845,1.27 31.115,1.27 31.75,0.635 32.385,1.27 33.655,1.27 34.29,0.635 34.925,1.27 36.195,1.27 36.83,0.635 37.465,1.27 38.735,1.27 39.37,0.635 40.005,1.27 41.275,1.27 41.91,0.635 42.545,1.27 43.815,1.27 44.45,0.635 45.085,1.27 46.355,1.27 46.99,0.635 47.625,1.27 48.895,1.27 49.53,0.635 49.53,-0.635 48.895,-1.27 47.625,-1.27 46.99,-0.635 46.355,-1.27 45.085,-1.27 44.45,-0.635 43.815,-1.27 42.545,-1.27 41.91,-0.635 41.275,-1.27 40.005,-1.27 39.37,-0.635 38.735,-1.27 37.465,-1.27 36.83,-0.635 36.195,-1.27 34.925,-1.27 34.29,-0.635 33.655,-1.27 32.385,-1.27 31.75,-0.635 31.115,-1.27 29.845,-1.27 29.21,-0.635 28.575,-1.27 27.305,-1.27 26.67,-0.635 26.035,-1.27 24.765,-1.27 24.13,-0.635 23.495,-1.27 22.225,-1.27 21.59,-0.635 20.955,-1.27 19.685,-1.27 19.05,-0.635 18.415,-1.27 17.145,-1.27 16.51,-0.635 15.875,-1.27 14.605,-1.27 13.97,-0.635 13.335,-1.27 12.065,-1.27 11.43,-0.635 10.795,-1.27 9.525,-1.27 8.89,-0.635 8.255,-1.27 6.985,-1.27 6.35,-0.635 5.715,-1.27 4.445,-1.27 3.81,-0.635 3.175,-1.27 1.905,-1.27 1.27,-0.635 0.635,-1.27 -0.635,-1.27 -1.27,-0.635
3D body: height 7.58, standoff -2.94, extent 39.37,-1.27 41.91,1.27
3D body: height 7.58, standoff -2.94, extent 41.91,-1.27 44.45,1.27
3D body: height 7.58, standoff -2.94, extent 44.45,-1.27 46.99,1.27
3D body: height 7.58, standoff -2.94, extent 46.99,-1.27 49.53,1.27
3D body: height 7.58, standoff -2.94, extent 29.21,-1.27 31.75,1.27
3D body: height 7.58, standoff -2.94, extent 31.75,-1.27 34.29,1.27
3D body: height 7.58, standoff -2.94, extent 34.29,-1.27 36.83,1.27
3D body: height 7.58, standoff -2.94, extent 36.83,-1.27 39.37,1.27
3D body: height 7.58, standoff -2.94, extent 19.05,-1.27 21.59,1.27
3D body: height 7.58, standoff -2.94, extent 21.59,-1.27 24.13,1.27
3D body: height 7.58, standoff -2.94, extent 24.13,-1.27 26.67,1.27
3D body: height 7.58, standoff -2.94, extent 26.67,-1.27 29.21,1.27
3D body: height 7.58, standoff -2.94, extent 8.89,-1.27 11.43,1.27
3D body: height 7.58, standoff -2.94, extent 11.43,-1.27 13.97,1.27
3D body: height 7.58, standoff -2.94, extent 13.97,-1.27 16.51,1.27
3D body: height 7.58, standoff -2.94, extent 16.51,-1.27 19.05,1.27
3D body: height 7.58, standoff -2.94, extent -1.27,-1.27 1.27,1.27
3D body: height 7.58, standoff -2.94, extent 1.27,-1.27 3.81,1.27
3D body: height 7.58, standoff -2.94, extent 3.81,-1.27 6.35,1.27
3D body: height 7.58, standoff -2.94, extent 6.35,-1.27 8.89,1.27

## HDR1X21 [mil]
pads (21):
  oct 62x62 hole 35: 1(0,0)
  round 62 hole 35: 2(100,0) 3(200,0) 4(300,0) 5(400,0) 6(500,0) 7(600,0) 8(700,0) 9(800,0) 10(900,0) 11(1000,0) 12(1100,0) 13(1200,0) 14(1300,0) 15(1400,0) 16(1500,0) 17(1600,0) 18(1700,0) 19(1800,0) 20(1900,0) 21(2000,0)
Top Overlay:
  lines w8: -50,-50 2050,-50 2050,50 25,50 -50,50 -50,-50
3D body: height 322.83, standoff -118.11, extent -45,-50 2055,48.36

## HDR1X22 [mil]
pads (22):
  oct 62x62 hole 35: 1(0,0)
  round 62 hole 35: 2(100,0) 3(200,0) 4(300,0) 5(400,0) 6(500,0) 7(600,0) 8(700,0) 9(800,0) 10(900,0) 11(1000,0) 12(1100,0) 13(1200,0) 14(1300,0) 15(1400,0) 16(1500,0) 17(1600,0) 18(1700,0) 19(1800,0) 20(1900,0) 21(2000,0) 22(2100,0)
Top Overlay:
  lines w8: -50,-50 -50,50 25,50 2150,50 2150,-50 -50,-50
3D body: height 322.83, standoff -118.11, extent -45,-50 2155,48.36

## HDR1X23 [mil]
pads (23):
  oct 62x62 hole 35: 1(0,0)
  round 62 hole 35: 2(100,0) 3(200,0) 4(300,0) 5(400,0) 6(500,0) 7(600,0) 8(700,0) 9(800,0) 10(900,0) 11(1000,0) 12(1100,0) 13(1200,0) 14(1300,0) 15(1400,0) 16(1500,0) 17(1600,0) 18(1700,0) 19(1800,0) 20(1900,0) 21(2000,0) 22(2100,0) 23(2200,0)
Top Overlay:
  lines w8: -50,-50 2250,-50 2250,50 25,50 -50,50 -50,-50
3D body: height 322.83, standoff -118.11, extent -45,-50 2255,48.36

## HDR1X24 [mil]
pads (24):
  oct 62x62 hole 35: 1(0,0)
  round 62 hole 35: 2(100,0) 3(200,0) 4(300,0) 5(400,0) 6(500,0) 7(600,0) 8(700,0) 9(800,0) 10(900,0) 11(1000,0) 12(1100,0) 13(1200,0) 14(1300,0) 15(1400,0) 16(1500,0) 17(1600,0) 18(1700,0) 19(1800,0) 20(1900,0) 21(2000,0) 22(2100,0) 23(2200,0) 24(2300,0)
Top Overlay:
  lines w8: -50,-50 2350,-50 2350,50 25,50 -50,50 -50,-50
3D body: height 118.11, standoff -322.83, extent -50,-50 2350,48.36

## HDR1X25 [mil]
pads (25):
  oct 62x62 hole 35: 1(0,0)
  round 62 hole 35: 2(100,0) 3(200,0) 4(300,0) 5(400,0) 6(500,0) 7(600,0) 8(700,0) 9(800,0) 10(900,0) 11(1000,0) 12(1100,0) 13(1200,0) 14(1300,0) 15(1400,0) 16(1500,0) 17(1600,0) 18(1700,0) 19(1800,0) 20(1900,0) 21(2000,0) 22(2100,0) 23(2200,0) 24(2300,0) 25(2400,0)
Top Overlay:
  lines w8: -50,-50 -50,50 25,50 2450,50 2450,-50 -50,-50
3D body: height 322.83, standoff -118.11, extent -50,-50 2450,48.36

## HDR2X2 [mm] "Connector; Header; 2x2 Position"
pads (4):
  rect 1.5x1.5 hole 0.9: 1(0,0)
  oct 1.5x1.5 hole 0.9: 2(0,2.54) 3(2.54,0) 4(2.54,2.54)
Top Overlay:
  lines w0.152: -1.27,-0.635 -0.635,-1.27 0.635,-1.27 1.27,-0.635 1.905,-1.27 3.175,-1.27 3.81,-0.635 3.81,0.635 3.175,1.27 3.81,1.905 3.81,3.175 3.175,3.81 1.905,3.81 1.27,3.175 0.635,3.81 -0.635,3.81 -1.27,3.175 -1.27,1.905 -0.635,1.27 -1.27,0.635 -1.27,-0.635
3D body: height 7.58, standoff -2.94, extent -1.27,-1.27 1.27,1.27
3D body: height 7.58, standoff -2.94, extent 1.27,-1.27 3.81,1.27
3D body: height 7.58, standoff -2.94, extent -1.27,1.27 1.27,3.81
3D body: height 7.58, standoff -2.94, extent 1.27,1.27 3.81,3.81